# Altium footprint library EMDC_Packages.PcbLib: 274 footprints (part 15 of 18)
Each footprint in its own frame and in the unit in brackets; x right, y up, seen from the top. Pads: shape width x height; smd on the part's side, far side on the other; paste and mask are expansions set on the pad; w line width, h text height; cw(c..) or ccw(c..) is an arc to the next point about the centre after c.
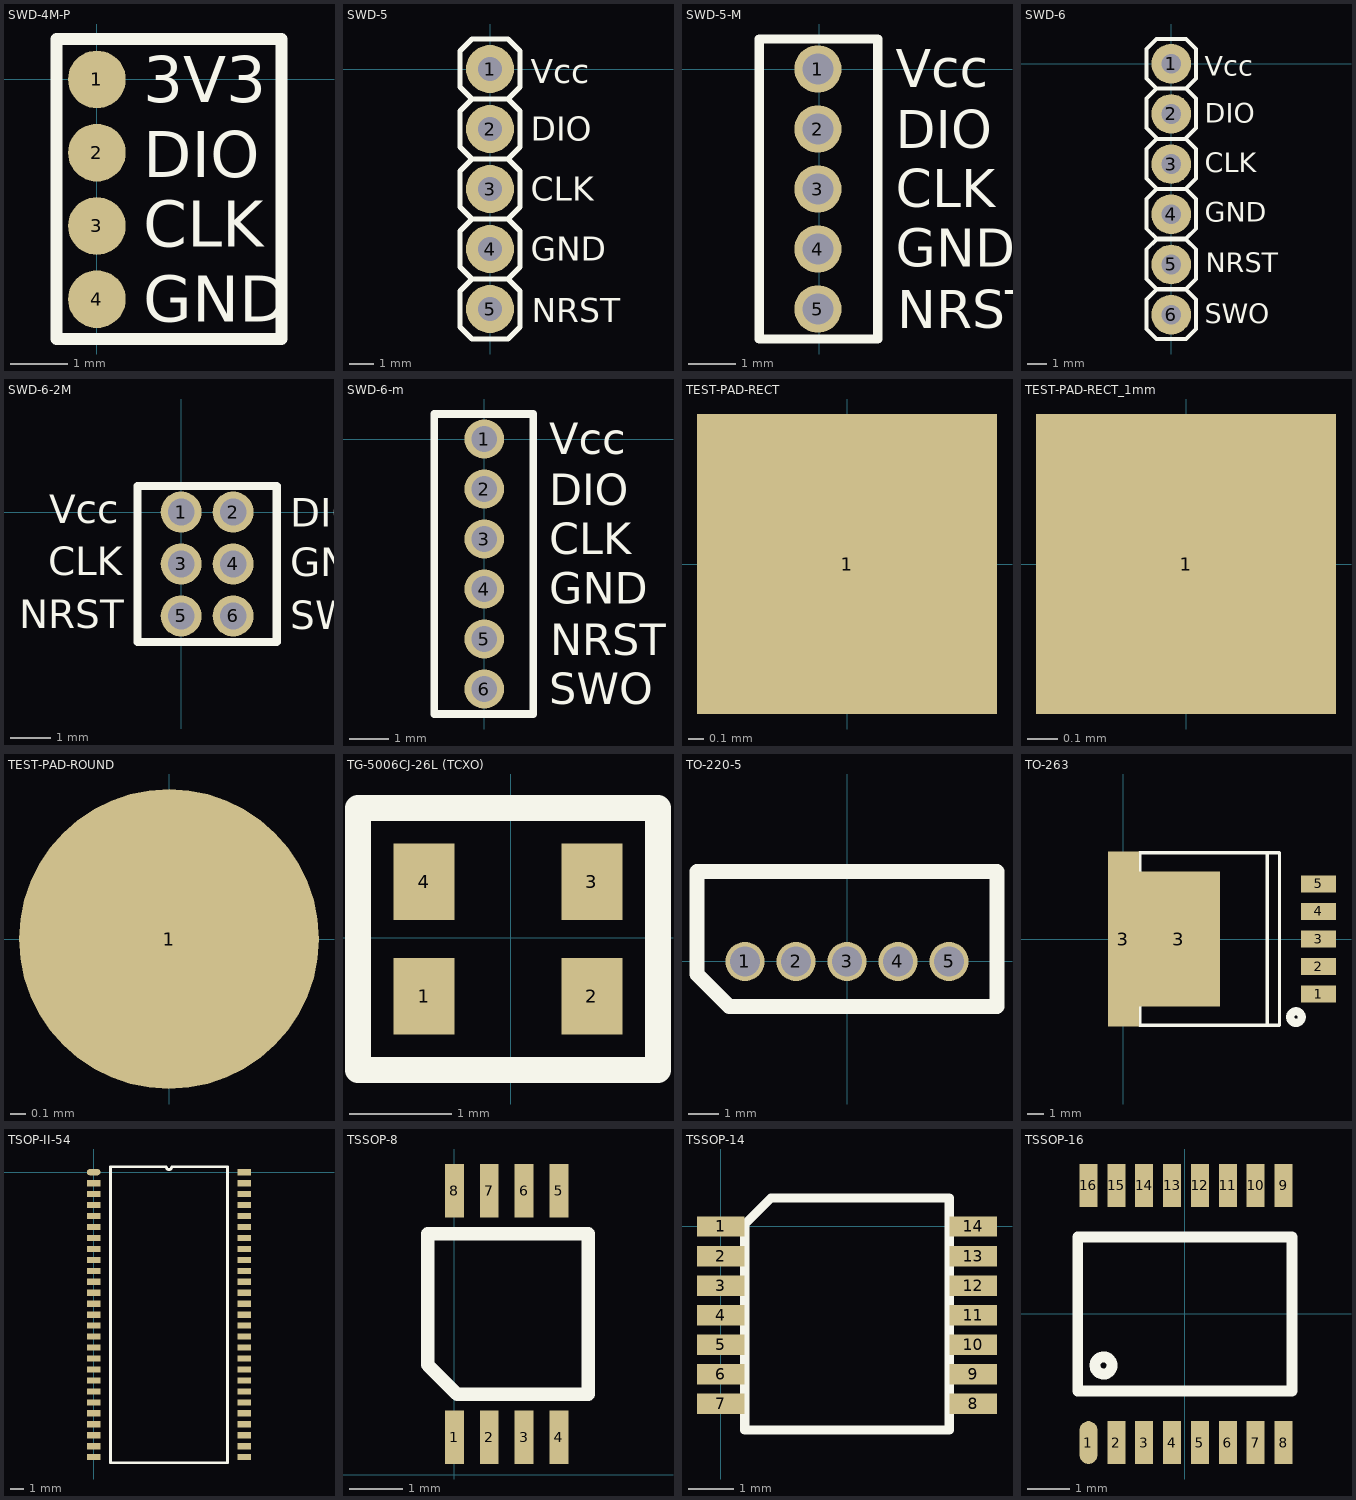
[diagram p14: the footprints below, top view; thin cyan lines are the x and y axes]

## SWD-4M-P [mm] "SWD-4 mini pads"
pads (4):
  round 1 smd: 1(0,0) 2(0,-1.27) 3(0,-2.54) 4(0,-3.81)
Top Overlay:
  lines w0.2: -0.7,-4.5 -0.7,0.7 3.2,0.7 3.2,-4.5 -0.7,-4.5
  text "GND" at 0.8,-4.2 h0.8
  text "CLK" at 0.8,-2.9 h0.8
  text "DIO" at 0.8,-1.7 h0.8
  text "3V3" at 0.8,-0.4 h0.8

## SWD-5 [mm]
pads (5):
  round 2 hole 1: 1(0,0) 2(0,-2.5) 3(0,-5) 4(0,-7.5) 5(0,-10)
Top Overlay:
  lines w0.2: -0.75,-8.75 0.75,-8.75 ; -0.75,-8.75 -1.25,-8.25 -1.25,-6.75 -0.75,-6.25 ; -0.75,-8.75 -1.25,-9.25 -1.25,-10.75 -0.75,-11.25 0.75,-11.25 1.25,-10.75 1.25,-9.25 0.75,-8.75 ; -0.75,-8.75 0.75,-8.75 ; -0.75,-6.25 0.75,-6.25 ; -0.75,-6.25 -1.25,-5.75 -1.25,-4.25 -0.75,-3.75 ; -0.75,-3.75 0.75,-3.75 ; -0.75,-3.75 -1.25,-3.25 -1.25,-1.75 -0.75,-1.25 ; -0.75,-1.25 0.75,-1.25 ; -0.75,-1.25 -1.25,-0.75 -1.25,0.75 -0.75,1.25 0.75,1.25 1.25,0.75 1.25,-0.75 0.75,-1.25 ; 0.75,-8.75 1.25,-8.25 1.25,-6.75 0.75,-6.25 ; 0.75,-6.25 1.25,-5.75 1.25,-4.25 0.75,-3.75 ; 0.75,-3.75 1.25,-3.25 1.25,-1.75 0.75,-1.25
  text "DIO" at 1.7,-3 h1
  text "CLK" at 1.7,-5.5 h1
  text "GND" at 1.7,-8 h1
  text "Vcc" at 1.7,-0.6 h1
  text "NRST" at 1.75,-10.55 h1
3D body "User Library-PLS-1.STEP": height 8.44, standoff -3, extent -1.27,-11.27 1.27,-8.73
3D body "User Library-PLS-1.STEP": height 8.44, standoff -3, extent -1.27,-8.77 1.27,-6.23
3D body "User Library-PLS-1.STEP": height 8.44, standoff -3, extent -1.27,-6.27 1.27,-3.73
3D body "User Library-PLS-1.STEP": height 8.44, standoff -3, extent -1.27,-3.77 1.27,-1.23
3D body "User Library-PLS-1.STEP": height 8.44, standoff -3, extent -1.27,-1.27 1.27,1.27

## SWD-5-M [mm]
pads (5):
  round 1 hole 0.65: 1(-0.025,0) 2(-0.025,-1.27) 3(-0.025,-2.54) 4(-0.025,-3.81) 5(-0.025,-5.08)
Top Overlay:
  lines w0.2: -1.27,-5.715 -1.27,0.635 1.245,0.635 1.245,-5.715 -1.27,-5.715
  text "Vcc" at 1.626,-0.381 h0.8
  text "GND" at 1.624,-4.19 h0.8
  text "CLK" at 1.626,-2.921 h0.8
  text "DIO" at 1.626,-1.676 h0.8
  text "NRST" at 1.651,-5.486 h0.8
3D body "PLL-2.stp": height 5.2, standoff -2.9, extent -1.125,-5.91 1.075,-2.96
3D body "PLL-3.stp": height 5.2, standoff -2.9, extent -1.125,-3.38 1.075,0.84

## SWD-6 [mm]
pads (6):
  round 2 hole 1: 1(0,0) 2(0,-2.54) 3(0,-5.08) 4(0,-7.62) 5(0,-10.16) 6(0,-12.7)
Top Overlay:
  lines w0.2: -0.75,-6.31 -1.25,-5.81 -1.25,-4.31 -0.75,-3.81 0.75,-3.81 1.25,-4.31 1.25,-5.81 0.75,-6.31 ; -0.75,-3.75 -1.25,-3.25 -1.25,-1.75 -0.75,-1.25 ; 0.75,-3.75 1.25,-3.25 1.25,-1.75 0.75,-1.25 ; -0.75,-1.25 0.75,-1.25 ; -0.75,-1.25 -1.25,-0.75 -1.25,0.75 -0.75,1.25 0.75,1.25 1.25,0.75 1.25,-0.75 0.75,-1.25 ; -1.25,-13.43 -0.75,-13.93 0.75,-13.93 1.25,-13.43 1.25,-11.93 0.75,-11.43 -0.75,-11.43 -1.25,-11.93 -1.25,-13.43 ; -1.25,-10.89 -1.25,-9.39 -0.75,-8.89 0.75,-8.89 1.25,-9.39 1.25,-10.89 0.75,-11.39 -0.75,-11.39 -1.25,-10.89 ; -1.25,-8.35 -0.75,-8.85 0.75,-8.85 1.25,-8.35 1.25,-6.85 0.75,-6.35 -0.75,-6.35 -1.25,-6.85 -1.25,-8.35
  text "SWO" at 1.7,-13.125 h1
  text "NRST" at 1.75,-10.55 h1
  text "Vcc" at 1.7,-0.6 h1
  text "GND" at 1.7,-8 h1
  text "CLK" at 1.7,-5.5 h1
  text "DIO" at 1.7,-3 h1
3D body "User Library-PLS-1.STEP": height 8.44, standoff -3, extent -1.27,-13.97 1.27,-11.43
3D body "User Library-PLS-1.STEP": height 8.44, standoff -3, extent -1.27,-11.43 1.27,-8.89
3D body "User Library-PLS-1.STEP": height 8.44, standoff -3, extent -1.27,-8.89 1.27,-6.35
3D body "User Library-PLS-1.STEP": height 8.44, standoff -3, extent -1.27,-6.35 1.27,-3.81
3D body "User Library-PLS-1.STEP": height 8.44, standoff -3, extent -1.27,-3.81 1.27,-1.27
3D body "User Library-PLS-1.STEP": height 8.44, standoff -3, extent -1.27,-1.27 1.27,1.27

## SWD-6-2M [mm]
pads (6):
  round 1 hole 0.65: 1(0,0) 2(1.27,0) 3(0,-1.27) 4(1.27,-1.27) 5(0,-2.54) 6(1.27,-2.54)
Top Overlay:
  lines w0.2: -1.067,-3.175 2.337,-3.175 2.337,0.635 -1.067,0.635 -1.067,-3.175
  text "DIO" at 2.667,-0.356 h0.7
  text "CLK" at -3.251,-1.549 h0.7
  text "GND" at 2.667,-1.575 h0.7
  text "Vcc" at -3.226,-0.279 h0.7
  text "NRST" at -3.962,-2.845 h0.7
  text "SWO" at 2.667,-2.87 h0.7
3D body "PLL-3.stp": height 5.2, standoff -2.9, extent -1.1,-3.38 1.1,0.84
3D body "PLL-3.stp": height 5.2, standoff -2.9, extent 0.17,-3.38 2.37,0.84

## SWD-6-m [mm]
pads (6):
  round 1 hole 0.65: 1(0,0) 2(0,-1.27) 3(0,-2.54) 4(0,-3.81) 5(0,-5.08) 6(0,-6.35)
Top Overlay:
  lines w0.2: -1.27,0.61 -1.27,-6.985 1.245,-6.985 ; -1.27,0.635 1.245,0.635 1.245,-6.96
  text "NRST" at 1.676,-5.486 h0.8
  text "DIO" at 1.651,-1.676 h0.8
  text "CLK" at 1.651,-2.921 h0.8
  text "GND" at 1.649,-4.19 h0.8
  text "Vcc" at 1.651,-0.381 h0.8
  text "SWO" at 1.651,-6.731 h0.8
3D body "PLL-3.stp": height 5.2, standoff -2.9, extent -1.1,-3.38 1.1,0.84
3D body "PLL-3.stp": height 5.2, standoff -2.9, extent -1.1,-7.19 1.1,-2.97

## TEST-PAD-RECT [mm]
pads (1):
  rect 2x2 smd: 1(0,0)

## TEST-PAD-RECT_1mm [mm]
pads (1):
  rect 1x1 smd: 1(0,0)

## TEST-PAD-ROUND [mm]
pads (1):
  round 2 smd: 1(0,0)

## TG-5006CJ-26L (TCXO) [mm]
pads (4):
  rect 0.6x0.75 smd: 1(-0.85,-0.575) 2(0.8,-0.575) 3(0.8,0.55) 4(-0.85,0.55)
Top Overlay:
  lines w0.254: -1.5,-1.3 1.45,-1.3 1.45,1.275 -1.5,1.275 -1.5,-1.3

## TO-220-5 [mm]
pads (5):
  round 1.3 hole 1: 1(-3.4,0) 2(-1.7,0) 3(0,0) 4(1.7,0) 5(3.4,0)
Top Overlay:
  lines w0.508: -5,-0.425 -3.925,-1.5 5,-1.5 5,3 -5,3 -5,-0.425
3D body "User Library-to-220-5 v2.STEP": height 25, standoff -2.82, extent -5.03,-2 5.13,2.95

## TO-263 [mm]
pads (7):
  rect 2.16x1.07 smd: 1(12.065,-3.404) 2(12.065,-1.702) 3(12.065,0) 4(12.065,1.702) 5(12.065,3.404)
  rect 1.91x10.8 smd: 3(0,0)
  rect 5.08x8.33 smd: 3(3.429,0)
Top Overlay:
  circle w0.5: c10.668,-4.826 r0.359
  lines w0.2: 8.89,-5.334 8.89,5.334 ; 1.016,-5.334 1.016,5.334 9.652,5.334 9.652,-5.334 1.016,-5.334
3D body "User Library-TO-263-5.STEP": height 4.56, standoff 0, extent -0.905,-5.06 13.11,5.1

## TSOP-II-54 [mm]
pads (54):
  oval 1x0.45 smd: 1(0,0)
  rect 1x0.45 smd: 2(0,-0.8) 3(0,-1.6) 4(0,-2.4) 5(0,-3.2) 6(0,-4) 7(0,-4.8) 8(0,-5.6) 9(0,-6.4) 10(0,-7.2) 11(0,-8) 12(0,-8.8) 13(0,-9.6) 14(0,-10.4) 15(0,-11.2) 16(0,-12) 17(0,-12.8) 18(0,-13.6) 19(0,-14.4) 20(0,-15.2) 21(0,-16) 22(0,-16.8) 23(0,-17.6) 24(0,-18.4) 25(0,-19.2) 26(0,-20) 27(0,-20.8) 28(11,-20.8) 29(11,-20) 30(11,-19.2) 31(11,-18.4) 32(11,-17.6) 33(11,-16.8) 34(11,-16) 35(11,-15.2) 36(11,-14.4) 37(11,-13.6) 38(11,-12.8) 39(11,-12) 40(11,-11.2) 41(11,-10.4) 42(11,-9.6) 43(11,-8.8) 44(11,-8) 45(11,-7.2) 46(11,-6.4) 47(11,-5.6) 48(11,-4.8) 49(11,-4) 50(11,-3.2) 51(11,-2.4) 52(11,-1.6) 53(11,-0.8) 54(11,0)
Top Overlay:
  lines w0.2: 1.235,-21.2 1.235,0.4 5.3,0.4 ccw(c5.5,0.4) 5.7,0.4 9.765,0.4 9.765,-21.2 1.235,-21.2
3D body "User Library-TSOP-54-1.step": height 1.25, standoff 0, extent -0.38,-21.51 11.38,0.71

## TSSOP-8 [mm]
pads (8):
  rect 0.35x1 smd: 1(0,0.7) 2(0.65,0.7) 3(1.3,0.7) 4(1.95,0.7) 5(1.95,5.3) 6(1.3,5.3) 7(0.65,5.3) 8(0,5.3)
Top Overlay:
  lines w0.254: -0.5,2.05 0.05,1.5 2.5,1.5 2.5,4.5 -0.5,4.5 -0.5,2.05
3D body "User Library-TSSOP-8 3_1x3_1.STEP": height 1.1, standoff 0, extent -0.55,0.5 2.55,5.5

## TSSOP-14 [mm]
pads (14):
  rect 1.05x0.45 smd: 1(0,0) 2(0,-0.65) 3(0,-1.3) 4(0,-1.95) 5(0,-2.6) 6(0,-3.25) 7(0,-3.9) 8(5.55,-3.9) 9(5.55,-3.25) 10(5.55,-2.6) 11(5.55,-1.95) 12(5.55,-1.3) 13(5.55,-0.65) 14(5.55,0)
Top Overlay:
  lines w0.2: 0.525,-4.475 5.025,-4.475 5.025,0.625 1.1,0.625 0.525,0.05 0.525,-4.475
3D body "SW3dPS-TSSOP14-1.STEP": height 1.1, standoff 0, extent -0.425,-4.425 5.975,0.575

## TSSOP-16 [mm]
pads (16):
  oval 0.42x1 smd: 1(-2.25,-3)
  rect 0.42x1 smd: 2(-1.6,-3) 3(-0.95,-3) 4(-0.3,-3) 5(0.35,-3) 6(1,-3) 7(1.65,-3) 8(2.3,-3) 9(2.3,3) 10(1.65,3) 11(1,3) 12(0.35,3) 13(-0.3,3) 14(-0.95,3) 15(-1.6,3) 16(-2.25,3)
Top Overlay:
  circle w0.254: c-1.9,-1.2 r0.2
  lines w0.254: -2.5,-1.8 2.5,-1.8 2.5,1.8 -2.5,1.8 -2.5,-1.8
3D body "User Library-TSSOP-16-1.STEP": height 1.1, standoff 0, extent -2.475,-3.2 2.525,3.2